# Altium footprint library core.PcbLib: 29 footprints (part 1 of 2)
Each footprint in its own frame and in the unit in brackets; x right, y up, seen from the top. Pads: shape width x height; smd on the part's side, far side on the other; paste and mask are expansions set on the pad; w line width, h text height; cw(c..) or ccw(c..) is an arc to the next point about the centre after c.
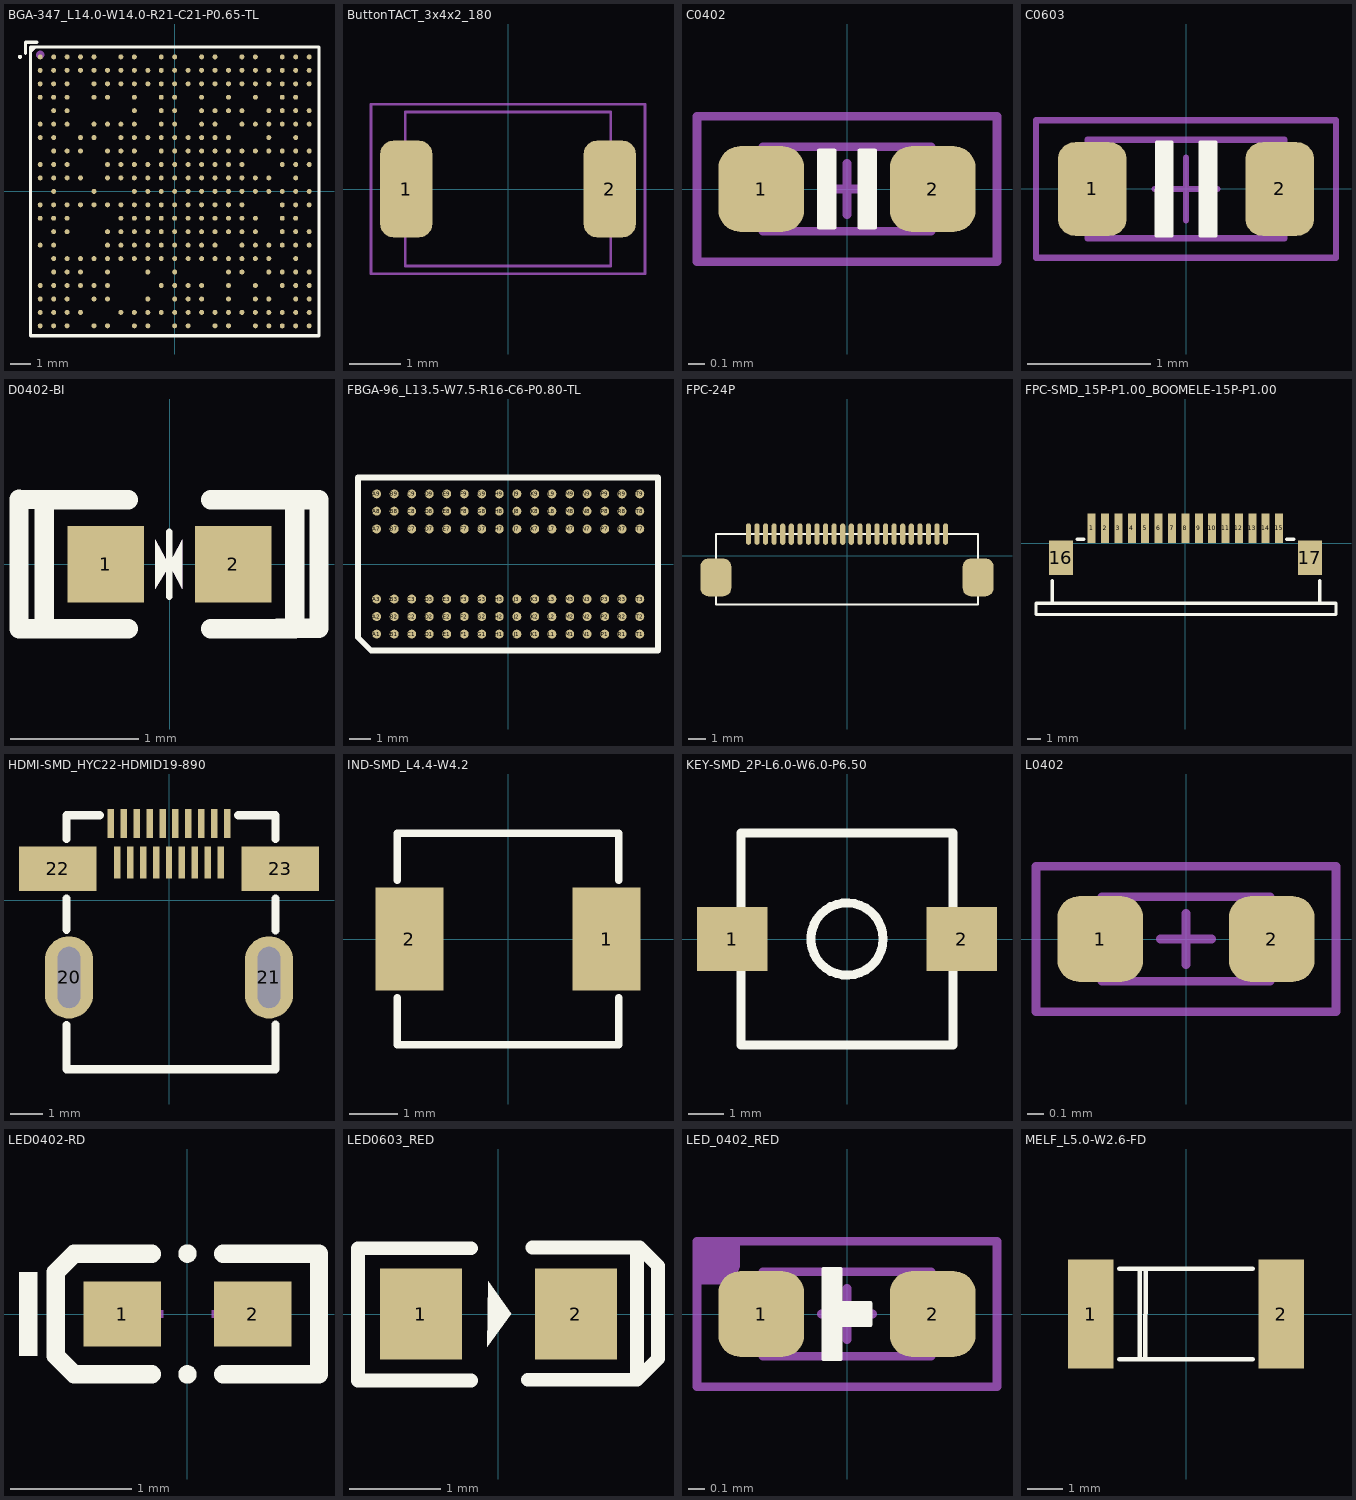
[diagram p0: the footprints below, top view; thin cyan lines are the x and y axes]

## BGA-347_L14.0-W14.0-R21-C21-P0.65-TL [mm]
pads (347):
  round 0.24 smd: A1(-6.5,6.5) A2(-5.85,6.5) A3(-5.2,6.5) A4(-4.55,6.5) A5(-3.9,6.5) A7(-2.6,6.5) A8(-1.95,6.5) A10(-0.65,6.5) A11(0,6.5) A13(1.3,6.5) A14(1.95,6.5) A16(3.25,6.5) A17(3.9,6.5) A19(5.2,6.5) A20(5.85,6.5) A21(6.5,6.5) AA1(-6.5,-6.5) AA2(-5.85,-6.5) AA3(-5.2,-6.5) AA5(-3.9,-6.5) AA6(-3.25,-6.5) AA8(-1.95,-6.5) AA9(-1.3,-6.5) AA11(0,-6.5) AA12(0.65,-6.5) AA14(1.95,-6.5) AA15(2.6,-6.5) AA17(3.9,-6.5) AA18(4.55,-6.5) AA19(5.2,-6.5) AA20(5.85,-6.5) AA21(6.5,-6.5) B1(-6.5,5.85) B2(-5.85,5.85) B3(-5.2,5.85) B4(-4.55,5.85) B5(-3.9,5.85) B6(-3.25,5.85) B7(-2.6,5.85) B8(-1.95,5.85) B9(-1.3,5.85) B10(-0.65,5.85) B11(0,5.85) B12(0.65,5.85) B13(1.3,5.85) B14(1.95,5.85) B15(2.6,5.85) B16(3.25,5.85) B17(3.9,5.85) B18(4.55,5.85) B19(5.2,5.85) B20(5.85,5.85) B21(6.5,5.85) C1(-6.5,5.2) C2(-5.85,5.2) C3(-5.2,5.2) C5(-3.9,5.2) C6(-3.25,5.2) C7(-2.6,5.2) C8(-1.95,5.2) C9(-1.3,5.2) C10(-0.65,5.2) C11(0,5.2) C12(0.65,5.2) C13(1.3,5.2) C14(1.95,5.2) C15(2.6,5.2) C16(3.25,5.2) C17(3.9,5.2) C18(4.55,5.2) C19(5.2,5.2) C20(5.85,5.2) C21(6.5,5.2) D1(-6.5,4.55) D2(-5.85,4.55) D3(-5.2,4.55) D5(-3.9,4.55) D6(-3.25,4.55) D8(-1.95,4.55) D10(-0.65,4.55) D11(0,4.55) D13(1.3,4.55) D15(2.6,4.55) D17(3.9,4.55) D19(5.2,4.55) D20(5.85,4.55) E2(-5.85,3.9) E3(-5.2,3.9) E8(-1.95,3.9) E10(-0.65,3.9) E11(0,3.9) E13(1.3,3.9) E14(1.95,3.9) E15(2.6,3.9) E16(3.25,3.9) E18(4.55,3.9) E19(5.2,3.9) E20(5.85,3.9) E21(6.5,3.9) F1(-6.5,3.25) F2(-5.85,3.25) F3(-5.2,3.25) F5(-3.9,3.25) F6(-3.25,3.25) F7(-2.6,3.25) F8(-1.95,3.25) F10(-0.65,3.25) F11(0,3.25) F13(1.3,3.25) F14(1.95,3.25) F16(3.25,3.25) F17(3.9,3.25) F18(4.55,3.25) F19(5.2,3.25) F20(5.85,3.25) F21(6.5,3.25) G1(-6.5,2.6) G2(-5.85,2.6) G4(-4.55,2.6) G5(-3.9,2.6) G7(-2.6,2.6) G8(-1.95,2.6) G9(-1.3,2.6) G10(-0.65,2.6) G11(0,2.6) G12(0.65,2.6) G13(1.3,2.6) G14(1.95,2.6) G15(2.6,2.6) G18(4.55,2.6) G20(5.85,2.6) H2(-5.85,1.95) H3(-5.2,1.95) H4(-4.55,1.95) H6(-3.25,1.95) H7(-2.6,1.95) H8(-1.95,1.95) H10(-0.65,1.95) H11(0,1.95) H12(0.65,1.95) H13(1.3,1.95) H14(1.95,1.95) H15(2.6,1.95) H16(3.25,1.95) H17(3.9,1.95) H18(4.55,1.95) H19(5.2,1.95) H20(5.85,1.95) H21(6.5,1.95) J1(-6.5,1.3) J2(-5.85,1.3) J3(-5.2,1.3) J6(-3.25,1.3) J7(-2.6,1.3) J8(-1.95,1.3) J9(-1.3,1.3) J10(-0.65,1.3) J11(0,1.3) J12(0.65,1.3) J13(1.3,1.3) J14(1.95,1.3) J15(2.6,1.3) J16(3.25,1.3) J19(5.2,1.3) J20(5.85,1.3) J21(6.5,1.3) K1(-6.5,0.65) K2(-5.85,0.65) K3(-5.2,0.65) K4(-4.55,0.65) K6(-3.25,0.65) K7(-2.6,0.65) K8(-1.95,0.65) K9(-1.3,0.65) K10(-0.65,0.65) K11(0,0.65) K12(0.65,0.65) K13(1.3,0.65) K14(1.95,0.65) K15(2.6,0.65) K16(3.25,0.65) K17(3.9,0.65) K18(4.55,0.65) K20(5.85,0.65) L2(-5.85,0) L5(-3.9,0) L8(-1.95,0) L9(-1.3,0) L10(-0.65,0) L11(0,0) L12(0.65,0) L13(1.3,0) L14(1.95,0) L15(2.6,0) L16(3.25,0) L17(3.9,0) L18(4.55,0) L19(5.2,0) L20(5.85,0) L21(6.5,0) M1(-6.5,-0.65) M2(-5.85,-0.65) M3(-5.2,-0.65) M4(-4.55,-0.65) M5(-3.9,-0.65) M6(-3.25,-0.65) M7(-2.6,-0.65) M8(-1.95,-0.65) M9(-1.3,-0.65) M10(-0.65,-0.65) M11(0,-0.65) M12(0.65,-0.65) M13(1.3,-0.65) M14(1.95,-0.65) M15(2.6,-0.65) M16(3.25,-0.65) M19(5.2,-0.65) M20(5.85,-0.65) M21(6.5,-0.65) N1(-6.5,-1.3) N2(-5.85,-1.3) N3(-5.2,-1.3) N7(-2.6,-1.3) N8(-1.95,-1.3) N9(-1.3,-1.3) N10(-0.65,-1.3) N11(0,-1.3) N12(0.65,-1.3) N13(1.3,-1.3) N14(1.95,-1.3) N15(2.6,-1.3) N16(3.25,-1.3) N17(3.9,-1.3) N19(5.2,-1.3) N20(5.85,-1.3) P2(-5.85,-1.95) P3(-5.2,-1.95) P6(-3.25,-1.95) P7(-2.6,-1.95) P8(-1.95,-1.95) P9(-1.3,-1.95) P10(-0.65,-1.95) P11(0,-1.95) P12(0.65,-1.95) P13(1.3,-1.95) P14(1.95,-1.95) P15(2.6,-1.95) P16(3.25,-1.95) P17(3.9,-1.95) P19(5.2,-1.95) P20(5.85,-1.95) P21(6.5,-1.95) R1(-6.5,-2.6) R2(-5.85,-2.6) R6(-3.25,-2.6) R7(-2.6,-2.6) R8(-1.95,-2.6) R9(-1.3,-2.6) R10(-0.65,-2.6) R11(0,-2.6) R12(0.65,-2.6) R13(1.3,-2.6) R14(1.95,-2.6) R16(3.25,-2.6) R17(3.9,-2.6) R18(4.55,-2.6) R19(5.2,-2.6) R20(5.85,-2.6) R21(6.5,-2.6) T2(-5.85,-3.25) T3(-5.2,-3.25) T4(-4.55,-3.25) T5(-3.9,-3.25) T6(-3.25,-3.25) T7(-2.6,-3.25) T8(-1.95,-3.25) T9(-1.3,-3.25) T10(-0.65,-3.25) T11(0,-3.25) T12(0.65,-3.25) T13(1.3,-3.25) T14(1.95,-3.25) T15(2.6,-3.25) T16(3.25,-3.25) T17(3.9,-3.25) T18(4.55,-3.25) T20(5.85,-3.25) U2(-5.85,-3.9) U3(-5.2,-3.9) U4(-4.55,-3.9) U6(-3.25,-3.9) U9(-1.3,-3.9) U11(0,-3.9) U15(2.6,-3.9) U16(3.25,-3.9) U18(4.55,-3.9) U19(5.2,-3.9) U20(5.85,-3.9) U21(6.5,-3.9) V1(-6.5,-4.55) V2(-5.85,-4.55) V3(-5.2,-4.55) V4(-4.55,-4.55) V5(-3.9,-4.55) V6(-3.25,-4.55) V10(-0.65,-4.55) V11(0,-4.55) V12(0.65,-4.55) V13(1.3,-4.55) V15(2.6,-4.55) V17(3.9,-4.55) V19(5.2,-4.55) V20(5.85,-4.55) V21(6.5,-4.55) W1(-6.5,-5.2) W2(-5.85,-5.2) W3(-5.2,-5.2) W5(-3.9,-5.2) W6(-3.25,-5.2) W9(-1.3,-5.2) W11(0,-5.2) W12(0.65,-5.2) W13(1.3,-5.2) W15(2.6,-5.2) W17(3.9,-5.2) W18(4.55,-5.2) W20(5.85,-5.2) W21(6.5,-5.2) Y1(-6.5,-5.85) Y2(-5.85,-5.85) Y3(-5.2,-5.85) Y4(-4.55,-5.85) Y7(-2.6,-5.85) Y8(-1.95,-5.85) Y9(-1.3,-5.85) Y10(-0.65,-5.85) Y11(0,-5.85) Y12(0.65,-5.85) Y13(1.3,-5.85) Y14(1.95,-5.85) Y15(2.6,-5.85) Y16(3.25,-5.85) Y17(3.9,-5.85) Y18(4.55,-5.85) Y19(5.2,-5.85) Y20(5.85,-5.85) Y21(6.5,-5.85)
Top Overlay:
  circle w0.1: c-7.476,6.5 r0.05
  region: -6.976,6.976 -6.656,6.976 -6.976,6.656
  lines w0.152: -7.204,6.656 -7.204,7.204 -6.656,7.204 ; -6.976,-6.976 -6.976,6.976 6.976,6.976 6.976,-6.976 -6.976,-6.976
Top Paste:
  drawing of 347 lines, arcs and shapes, not listed
Mechanical 15:
  circle w0.2: c-6.5,6.6 r0.1
  region: -6.976,6.976 -6.656,6.976 -6.976,6.656
3D body "User Library-BGA256-14x14-P0_8.SLDPRT": height -0.48, standoff -2.13, extent -7.015,-7 6.985,7

## ButtonTACT_3x4x2_180 [mil]
height 78.74
pads (2):
  rrect50% 40x74 smd: 1(-78,0) 2(78,0)
Mechanical 13:
  lines w2: -78.73,-59.05 78.75,-59.05 78.75,59.06 -78.74,59.06 -78.74,-59.06
Mechanical 14:
  lines w2: -105,-65 105,-65 105,65 -105,65 -105,-65
3D body "20041.stp": height 62.99, standoff 0, extent -78.73,-49.2 78.75,49.22

## C0402 [mil]
height 21.65
pads (2):
  rrect50% 20x20 smd: 1(-20,0) 2(20,0)
Top Overlay:
  region: 6.5,-9 3,-9 3,9 6.5,9
  region: -6.5,9 -3,9 -3,-9 -6.5,-9
  lines w1: -6.5,-9 -6.5,9 -3,9 -3,-9 -6.5,-9 ; 3,-9 6.5,-9 6.5,9 3,9 3,-9
Mechanical 13:
  lines w2: -6,0 6,0 ; 0,-6 0,6 ; -19.69,-9.84 19.68,-9.84 19.68,9.84 -19.69,9.84 -19.69,-9.84
Mechanical 14:
  lines w2: -35,-17 35,-17 35,17 -35,17 -35,-17
3D body "CAPC1005X05L.step": height 19.68, standoff 0, extent -19.68,-9.84 19.68,9.84

## C0603 [mil]
height 31.5
pads (2):
  rrect50% 22x30 smd: 1(-30,0) 2(30,0)
Top Overlay:
  region: 4.5,-15 9.5,-15 9.5,15 4.5,15
  region: -4.5,15 -9.5,15 -9.5,-15 -4.5,-15
  lines w1: -9.5,-15 -4.5,-15 -4.5,15 -9.5,15 -9.5,-15 ; 4.5,-15 4.5,15 9.5,15 9.5,-15 4.5,-15
Mechanical 13:
  lines w2: -10,0 10,0 ; 0,-10 0,10 ; -31.5,-15.75 31.5,-15.75 31.5,15.75 -31.5,15.75 -31.5,-15.75
Mechanical 14:
  lines w2: -48,-22 48,-22 48,22 -48,22 -48,-22
3D body "CAPC1608X08L.step": height 31.5, standoff 0, extent -31.49,-15.74 31.5,15.75

## D0402-BI [mm]
pads (2):
  rect 0.6x0.6 smd: 1(-0.5,0) 2(0.5,0)
Top Overlay:
  region: 0,-0.01 -0.11,-0.19 -0.11,-0.01 -0.11,0.19
  region: 0,0 0.1,0.19 0.1,-0.19
  lines w0.051: 0,-0.254 0,0.254
  lines w0.152: -1.17,-0.504 -0.981,-0.504 ; -0.975,-0.504 -1.178,-0.504 -1.178,0.508 -0.981,0.504 ; -0.324,0.504 -0.981,0.504 ; 0.324,-0.504 0.981,-0.504 0.981,0.504 ; 0.324,0.504 0.981,0.504 ; 0.847,-0.5 1.17,-0.5 1.17,0.504 0.981,0.504 ; -0.981,-0.504 -0.324,-0.504 -0.981,-0.504 ; -0.981,-0.504 -0.981,0.504 ; -0.981,-0.504 -0.981,0.504
Top Paste:
  region: -0.18,0.225 -0.18,-0.225 -0.25,-0.275 -0.73,-0.275 -0.78,-0.225 -0.78,0.225 -0.73,0.275 -0.25,0.275
  region: 0.78,0.225 0.78,-0.225 0.73,-0.275 0.25,-0.275 0.18,-0.225 0.18,0.225 0.25,0.275 0.73,0.275
Mechanical 15:
  region: 0,-0.01 -0.11,-0.19 -0.11,-0.01 -0.11,0.19
  region: 0,0 0.1,0.19 0.1,-0.19

## FBGA-96_L13.5-W7.5-R16-C6-P0.80-TL [mil] "FBGA96(HYNIX_SAMSUNG_512MX16_DDR3)"
pads (96):
  rrect100% 16x16 smd: A1(-236.22,-125.98) A2(-236.22,-94.49) A3(-236.22,-62.99) A7(-236.22,63) A8(-236.22,95) A9(-236.22,126) B1(-204.72,-125.98) B2(-204.72,-94.49) B3(-204.72,-62.99) B7(-204.72,63) B8(-204.72,95) B9(-204.72,126) C1(-173.23,-125.98) C2(-173.23,-94.49) C3(-173.23,-62.99) C7(-173.23,63) C8(-173.23,95) C9(-173.23,126) D1(-141.73,-125.98) D2(-141.73,-94.49) D3(-141.73,-62.99) D7(-141.73,63) D8(-141.73,95) D9(-141.73,126) E1(-110.24,-125.98) E2(-110.24,-94.49) E3(-110.24,-62.99) E7(-110.24,63) E8(-110.24,95) E9(-110.24,126) F1(-78.74,-125.98) F2(-78.74,-94.49) F3(-78.74,-62.99) F7(-78.74,63) F8(-78.74,95) F9(-78.74,126) G1(-47.24,-125.98) G2(-47.24,-94.49) G3(-47.24,-62.99) G7(-47.24,63) G8(-47.24,95) G9(-47.24,126) H1(-15.75,-125.98) H2(-15.75,-94.49) H3(-15.75,-62.99) H7(-15.75,63) H8(-15.75,95) H9(-15.75,126) J1(16,-125.98) J2(16,-94.49) J3(16,-62.99) J7(16,63) J8(16,95) J9(16,126) K1(48,-125.98) K2(48,-94.49) K3(48,-62.99) K7(48,63) K8(48,95) K9(48,126) L1(79,-125.98) L2(79,-94.49) L3(79,-62.99) L7(79,63) L8(79,95) L9(79,126) M1(111,-125.98) M2(111,-94.49) M3(111,-62.99) M7(111,63) M8(111,95) M9(111,126) N1(142,-125.98) N2(142,-94.49) N3(142,-62.99) N7(142,63) N8(142,95) N9(142,126) P1(174,-125.98) P2(174,-94.49) P3(174,-62.99) P7(174,63) P8(174,95) P9(174,126) R1(205,-125.98) R2(205,-94.49) R3(205,-62.99) R7(205,63) R8(205,95) R9(205,126) T1(237,-125.98) T2(237,-94.49) T3(237,-62.99) T7(237,63) T8(237,95) T9(237,126)
Top Overlay:
  lines w10: -269.69,-131.89 -246.06,-155.51 269.69,-155.51 269.69,155.51 -269.69,155.51 -269.69,-131.89
3D body "User Library-FBGA 96 7_5x13.sldprt": height 29.92, standoff -13.04, extent -255,-150 256.81,145.27

## FPC-24P [mm]
pads (26):
  oval 0.3x1.25 smd: 1(5.75,1.263) 2(5.25,1.263) 3(4.75,1.263) 4(4.25,1.263) 5(3.75,1.263) 6(3.25,1.263) 7(2.75,1.263) 8(2.25,1.263) 9(1.75,1.263) 10(1.25,1.263) 11(0.75,1.263) 12(0.25,1.263) 13(-0.25,1.263) 14(-0.75,1.263) 15(-1.25,1.263) 16(-1.75,1.263) 17(-2.25,1.263) 18(-2.75,1.263) 19(-3.25,1.263) 20(-3.75,1.263) 21(-4.25,1.263) 22(-4.75,1.263) 23(-5.25,1.263) 24(-5.75,1.263)
  rrect50% 1.8x2.2 smd: ""(-7.65,-1.263) ""(7.65,-1.263)
Top Overlay:
  lines w0.127: -7.65,-2.85 -7.65,1.263 7.65,1.263 7.65,-2.85 -7.65,-2.85
3D body "12312312.stp": height 2.12, standoff 0.08, extent -8.75,-3.716 8.75,1.684

## FPC-SMD_15P-P1.00_BOOMELE-15P-P1.00 [mm]
pads (17):
  rect 0.6x2.2 smd: 1(-6.999,1.103) 2(-5.999,1.103) 3(-5,1.103) 4(-4,1.103) 5(-3,1.103) 6(-2.001,1.103) 7(-0.999,1.103) 8(0.001,1.103) 9(1.001,1.103) 10(2.001,1.103) 11(3.001,1.103) 12(4.001,1.103) 13(5,1.104) 14(5.999,1.104) 15(6.999,1.103)
  rect 1.8x2.6 smd: 16(-9.299,-1.104) 17(9.299,-1.102)
Top Overlay:
  lines w0.254: -11.158,-5.338 10.039,-5.338 ; -11.158,-5.337 -11.158,-4.507 ; -11.158,-4.498 11.249,-4.498 ; -9.959,-4.478 -9.959,-2.8 ; -8.089,0.272 -7.589,0.272 ; 7.582,0.272 8.082,0.272 ; 10.039,-4.498 10.04,-2.8 ; 10.049,-5.338 11.249,-5.338 11.249,-4.508
3D body "x10a20l15x.stp": height 1.99, standoff -0.01, extent -9.95,-4.901 9.95,1.859

## HDMI-SMD_HYC22-HDMID19-890 [mm]
pads (23):
  rect 0.2x0.9 smd: 1(1.8,2.388) 3(1.4,2.388) 5(1,2.388) 7(0.6,2.388) 9(0.2,2.388) 11(-0.2,2.388) 13(-0.6,2.388) 15(-1,2.388) 17(-1.4,2.388) 19(-1.8,2.388)
  rect 0.2x1 smd: 2(1.6,1.173) 4(1.2,1.173) 6(0.8,1.173) 8(0.4,1.173) 10(0,1.173) 12(-0.4,1.173) 14(-0.8,1.173) 16(-1.2,1.173) 18(-1.6,1.173)
  oval 1.5x2.55 hole 0.7 slot 1.9 at 90 deg: 20(-3.1,-2.387) 21(3.1,-2.387)
  rect 2.4x1.38 smd: 22(-3.45,0.982) 23(3.45,0.982)
Top Overlay:
  lines w0.254: -3.175,-3.865 -3.175,-5.232 3.302,-5.232 3.302,-3.844 ; -3.175,-0.91 -3.175,0.061 ; -3.175,1.904 -3.175,2.642 -2.146,2.642 ; 2.146,2.642 3.302,2.642 3.302,1.904 ; 3.302,-0.931 3.302,0.061
Top Paste:
  region: -3.85,-1.863 -3.85,-1.764 -3.799,-1.573 -3.7,-1.402 -3.56,-1.262 -3.389,-1.164 -3.199,-1.113 -3.001,-1.113 -2.81,-1.164 -2.639,-1.262 -2.5,-1.402 -2.401,-1.573 -2.35,-1.764 -2.35,-1.863 -2.35,-2.913 -2.35,-3.011 -2.401,-3.202 -2.5,-3.373 -2.639,-3.513 -2.81,-3.612 -3.001,-3.663 -3.199,-3.663 -3.389,-3.612 -3.56,-3.513 -3.7,-3.373 -3.799,-3.202 -3.85,-3.011 -3.85,-2.913
  region: 2.35,-1.863 2.35,-1.764 2.401,-1.573 2.5,-1.402 2.639,-1.262 2.81,-1.164 3.001,-1.113 3.199,-1.113 3.389,-1.164 3.56,-1.262 3.7,-1.402 3.799,-1.573 3.85,-1.764 3.85,-1.863 3.85,-2.913 3.85,-3.011 3.799,-3.202 3.7,-3.373 3.56,-3.513 3.389,-3.612 3.199,-3.663 3.001,-3.663 2.81,-3.612 2.639,-3.513 2.5,-3.373 2.401,-3.202 2.35,-3.011 2.35,-2.913
  region: 2.25,1.673 4.65,1.673 4.65,0.293 2.25,0.293
  region: -4.65,1.673 -2.25,1.673 -2.25,0.293 -4.65,0.293
  region: 1.685,2.838 1.915,2.838 1.915,1.938 1.685,1.938
  region: 1.485,1.673 1.715,1.673 1.715,0.673 1.485,0.673
  region: 1.285,2.838 1.515,2.838 1.515,1.938 1.285,1.938
  region: 1.085,1.673 1.315,1.673 1.315,0.673 1.085,0.673
  region: 0.885,2.838 1.115,2.838 1.115,1.938 0.885,1.938
  region: 0.685,1.673 0.915,1.673 0.915,0.673 0.685,0.673
  region: 0.485,2.838 0.715,2.838 0.715,1.938 0.485,1.938
  region: 0.285,1.673 0.515,1.673 0.515,0.673 0.285,0.673
  region: 0.085,2.838 0.315,2.838 0.315,1.938 0.085,1.938
  region: -0.115,1.673 0.115,1.673 0.115,0.673 -0.115,0.673
  region: -0.315,2.838 -0.085,2.838 -0.085,1.938 -0.315,1.938
  region: -0.515,1.673 -0.285,1.673 -0.285,0.673 -0.515,0.673
  region: -0.715,2.838 -0.485,2.838 -0.485,1.938 -0.715,1.938
  region: -0.915,1.673 -0.685,1.673 -0.685,0.673 -0.915,0.673
  region: -1.115,2.838 -0.885,2.838 -0.885,1.938 -1.115,1.938
  region: -1.315,1.673 -1.085,1.673 -1.085,0.673 -1.315,0.673
  region: -1.515,2.838 -1.285,2.838 -1.285,1.938 -1.515,1.938
  region: -1.715,1.673 -1.485,1.673 -1.485,0.673 -1.715,0.673
  region: -1.915,2.838 -1.685,2.838 -1.685,1.938 -1.915,1.938
3D body "0.40mm Micro HDMI Conn RA Recp SMT 19w.SLDPRT": height 2.92, standoff -0.6, extent -4.45,-4.826 4.45,2.674

## IND-SMD_L4.4-W4.2 [mm]
pads (2):
  rect 1.4x2.12 smd: 1(2.028,0) 2(-2.028,0)
Top Overlay:
  lines w0.152: -2.276,-1.212 -2.276,-2.176 2.276,-2.176 2.276,-1.212 ; -2.276,1.212 -2.276,2.176 2.276,2.176 2.276,1.212
3D body "74437324033.SLDPRT": height 1.7, standoff -0.1, extent -2.225,-2.03 2.225,2.03

## KEY-SMD_2P-L6.0-W6.0-P6.50 [mm]
pads (2):
  rect 2x1.8 smd: 1(-3.25,0) 2(3.25,0)
Top Overlay:
  circle w0.254: c0,0 r1.024
  lines w0.254: -3,-3 -3,3 3,3 3,-3 -3,-3
3D body "ts-1199a-b-b.SLDPRT": height 5, standoff 0, extent -3.3,-3 3.3,3

## L0402 [mil]
pads (2):
  rrect50% 20x20 smd: 1(-20,0) 2(20,0)
Mechanical 13:
  lines w2: -6,0 6,0 ; 0,-6 0,6 ; -19.69,-9.84 19.68,-9.84 19.68,9.84 -19.69,9.84 -19.69,-9.84
Mechanical 14:
  lines w2: -35,-17 -35,17 35,17 35,-17 -35,-17
3D body "RESC1005X03L.step": height 13.78, standoff 0, extent -19.68,-9.84 19.69,9.85

## LED0402-RD [mm]
pads (2):
  rect 0.636x0.54 smd: 1(-0.538,0) 2(0.538,0)
Top Overlay:
  circle w0.076: c0,-0.499 r0.038
  circle w0.076: c0,0.499 r0.038
  region: -1.237,-0.346 -1.237,0.346 -1.39,0.346 -1.39,-0.346
  lines w0.152: -0.296,-0.499 -0.933,-0.499 -1.085,-0.346 -1.085,0.346 -0.933,0.499 -0.296,0.499 ; 0.296,-0.499 1.085,-0.499 1.085,0.499 0.296,0.499
Top Paste:
  region: 0.198,-0.23 0.198,0.23 0.238,0.27 0.816,0.27 0.856,0.23 0.856,-0.23 0.816,-0.27 0.238,-0.27
  region: -0.198,-0.23 -0.198,0.23 -0.238,0.27 -0.816,0.27 -0.856,0.23 -0.856,-0.23 -0.816,-0.27 -0.238,-0.27
Mechanical 15:
  region: -0.44,-0.03 -0.44,0.03 -0.2,0.03 -0.2,-0.03
  region: 0.44,-0.03 0.44,0.03 0.2,0.03 0.2,-0.03
  region: 0.35,-0.2 0.35,0.2 0.29,0.2 0.29,-0.2
3D body "User Library-LED-0402.SLDPRT": height 0.45, standoff 0, extent -0.505,-0.25 0.505,0.25

## LED0603_RED [mm]
pads (2):
  rect 0.9x1 smd: 1(-0.85,0) 2(0.85,0)
Top Overlay:
  region: -0.11,0.36 -0.12,-0.36 0.14,0
  lines w0.15: -0.3,-0.73 -1.54,-0.73 -1.54,0.72 -0.3,0.72 ; 0.32,-0.72 1.52,-0.72 ; 0.37,0.73 1.52,0.73 ; 1.52,-0.72 1.72,-0.52 1.75,-0.49 1.75,0.53 1.55,0.73 1.52,0.73 ; 1.52,-0.72 1.52,0.73
3D body "ALSRobot-LED0603(G).SLDPRT": height 0.6, standoff 0, extent -0.81,-0.4 0.81,0.4

## LED_0402_RED [mil]
height 31.5
pads (2):
  rrect50% 20x20 smd: 1(-20,0) 2(20,0)
Top Overlay:
  region: -5.5,10.5 -1.5,10.5 -1.5,2.5 5.5,2.5 5.5,-2.5 -1.5,-2.5 -1.5,-10.5 -5.5,-10.5
  lines w1: -5.5,-10.5 -1.5,-10.5 -1.5,-2.5 5.5,-2.5 5.5,2.5 -1.5,2.5 -1.5,10.5 -5.5,10.5 -5.5,-10.5
Mechanical 13:
  lines w2: -6,0 6,0 ; 0,-6 0,6 ; -19.69,-9.84 -19.69,9.84 19.68,9.84 19.68,-9.84 -19.69,-9.84
Mechanical 14:
  region: -35,17 -25,17 -25,12 -25,11.01 -25.76,9.17 -27.17,7.76 -29.01,7 -30,7 -35,7
  lines w2: -35,-17 -35,17 35,17 35,-17 -35,-17
  text ".Designator" at -30,-45 h40
3D body "User Library-led_0402LED0402 red_.STEP": height 17.72, standoff 0, extent -19.88,-9.84 19.89,9.85

## MELF_L5.0-W2.6-FD [mil]
pads (2):
  rect 50x120 smd: 1(-105,0) 2(105,0)
Top Overlay:
  lines w5: -73.4,-50 73.4,-50 ; -73.4,50 73.4,50 ; -50.85,-50 -50.85,50 ; -45,-50 -44.47,50